# Altium integrated library Integrated_Library_Kylin915.IntLib: 131 symbols
Pins are listed as number, name and electrical type; pins without a type are passive.

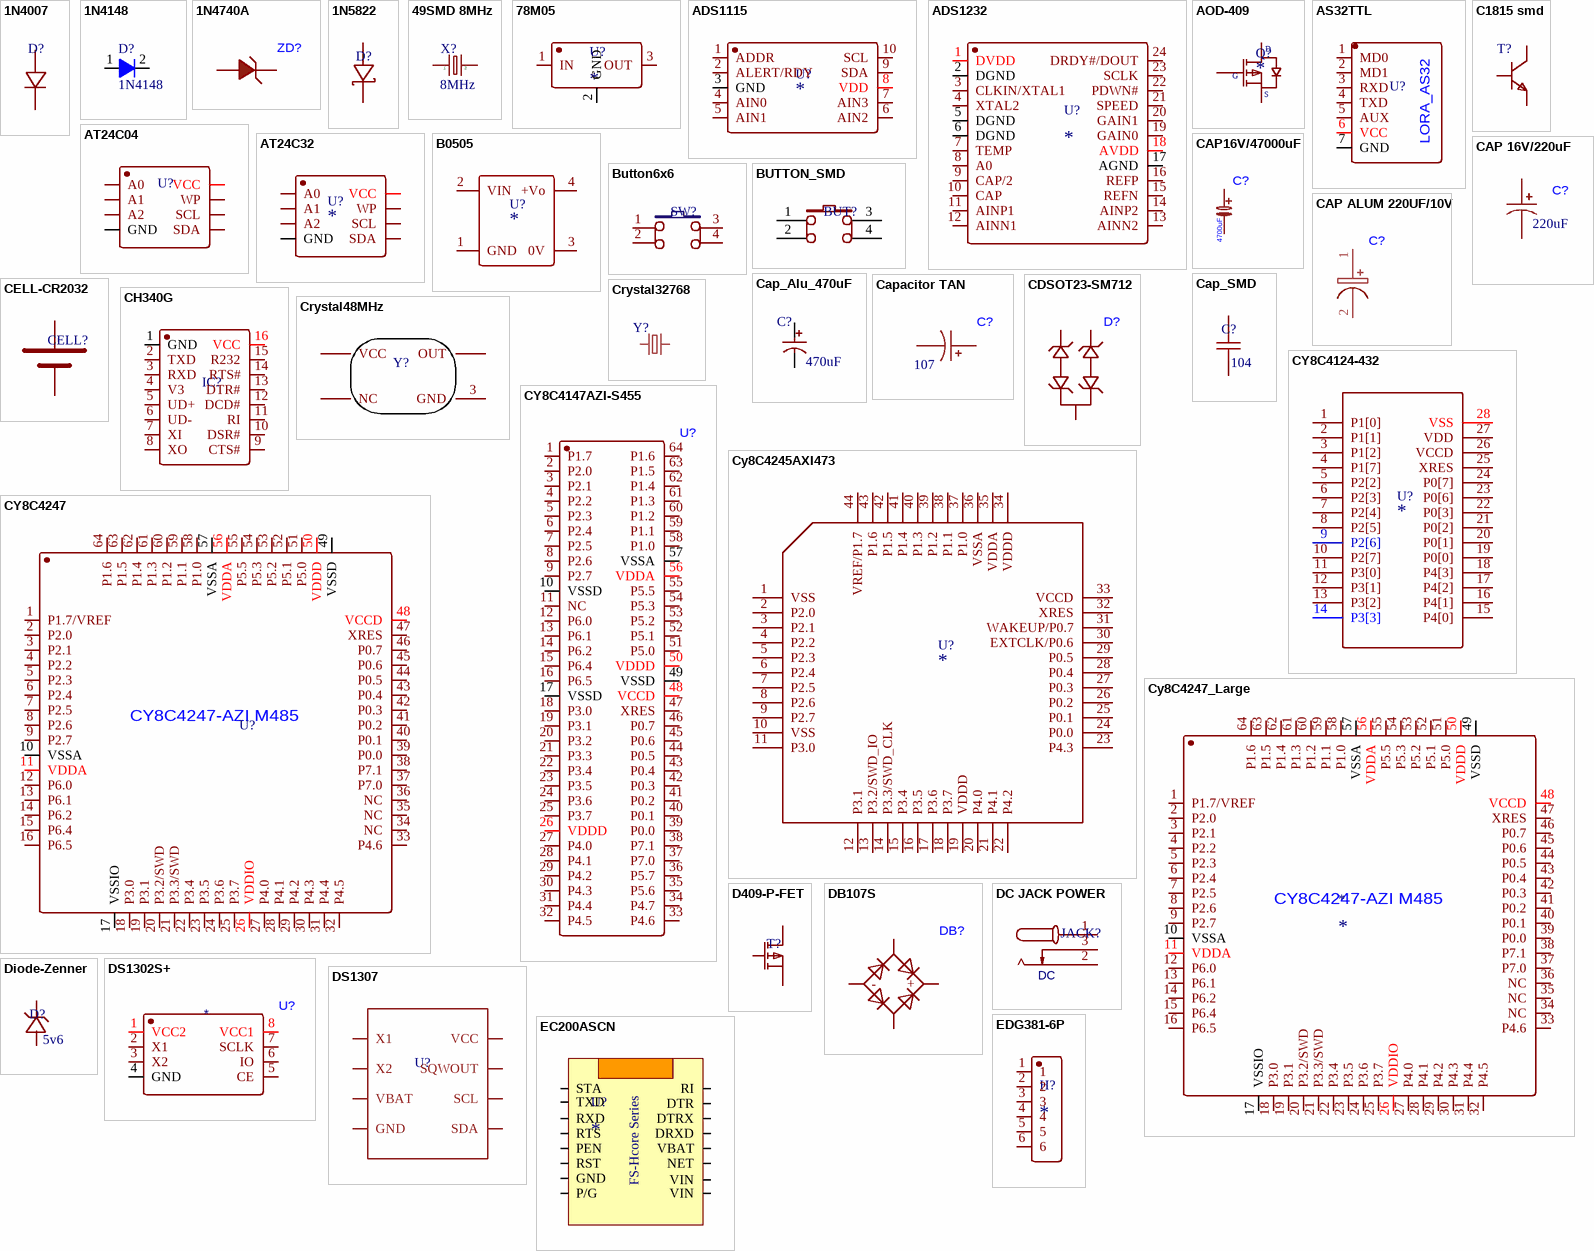
[diagram p0: symbols 1N4007 to EDG381-6P]

## 1N4007
designator D?  (value not drawn)
diode SMD M7
footprint Diode M7 (diode reflectifer)
pins: 1 A, 2 K

## 1N4148
designator D?
Diode Fast Switching; Value: 1N4148
footprint SOD-123
pins: 1 A, 2 K

## 1N4740A
designator ZD?
Zenner diode 10V smd
footprint 1N4740A (1N4740A smd zm4740)
pins: 1 A, 2 K

## 1N5822
designator D?  (value not drawn)
Didoe Schotky SS34 SMD
footprint Diode SS34 (diode schotky)
pins: 1 A, 2 K

## 49SMD 8MHz
designator X?  value 8MHz  (hidden comment: *)
Crystal 49SMD
footprint 49SMD (Crystal 8MHz 49SMD)
pins: 1, 2

## 78M05
designator U?
IC linear voltage
footprint TO252-3 (Pin package to 252)
pins: 1 IN, 2 GND, 3 OUT

## ADS1115
designator U?
AD conveter 24bits 80sps
footprint SOP10 (for ADS1115)
pins: 1 ADDR, 2 ALERT/RDY, 3 GND, 4 AIN0, 5 AIN1, 6 AIN2, 7 AIN3, 8 VDD, 9 SDA, 10 SCL

## ADS1232
designator U?
IC ADC 24bis high precesion
footprint TSOP24 (IC ADS1232)
pins: 1 DVDD, 2 DGND, 3 CLKIN/XTAL1, 4 XTAL2, 5 DGND, 6 DGND, 7 TEMP, 8 A0, 9 CAP/2, 10 CAP, 11 AINP1, 12 AINN1, 13 AINN2, 14 AINP2, 15 REFN, 16 REFP, 17 AGND, 18 AVDD, 19 GAIN0, 20 GAIN1, 21 SPEED, 22 PDWN#, 23 SCLK, 24 DRDY#/DOUT

## AOD-409
designator Q?
P-chanel mosfet  TO252
footprint TO252 (PIN TO252)
pins: 1 G, 2 D, 3 S

## AS32TTL
designator U?  (value not drawn)
module UART lora 1W
footprint AS32TTL (module lora uart)
pins: 1 MD0, 2 MD1, 3 RXD, 4 TXD, 5 AUX, 6 VCC, 7 GND
text: LORA_AS32

## AT24C04
designator U?  (value not drawn)
IC eeprom 1kbits
footprint SOIC8 (SOIC 8 pins)
pins: 1 A0, 2 A1, 3 A2, 4 GND, 5 SDA, 6 SCL, 7 WP, 8 VCC

## AT24C32
designator U?
IC ROM I2C
footprint SOIC8 (SOIC 8 pins)
pins: 1 A0, 2 A1, 3 A2, 4 GND, 5 SDA, 6 SCL, 7 WP, 8 VCC

## B0505
designator U?
IC power isolation
footprint B0505 (IC power isolation 5V)
pins: 1 GND, 2 VIN, 3 0V, 4 +Vo

## Button6x6
designator SW?  (value not drawn)
button 6x6 mm
footprint Key6x6Dip (button 6x6x6mm)
footprint Button6x6smd (key smd)
pins: 1, 2, 3, 4

## BUTTON_SMD
designator BUT?  (value not drawn)
BUTTON SMD 4 pins
footprint BUTTON_SMD (button smd)
footprint BUTTON12DIP (Button 12x12x9 mm)
footprint BUTTON12SMD (Button 12x12smd)
pins: 1, 2, 3, 4

## C1815 smd
designator T?  (value not drawn)
C1815 smd sop23
footprint SOT-23 (BIJ-SOT23)
pins: 1 B, 2 E, 3 C

## CAP16V/47000uF
designator C?
4.700uF/16V_CAP-D16.0XF7.5
footprint CAP16V/47000uF (4.700UF/16V_CAP-D16.0XF7.5)
pins: 1, 2
text: 4700uF

## CAP 16V/220uF
designator C?  value 220uF
CAPACITOR POLYMER
footprint CAP POLY 220UF 16V (CAPACITOR POLYMER 220UF 16V 8X9MM SMD)
pins: 1, 2

## CAP ALUM 220UF/10V
designator C?
CAP ALUM 220UF 20% 10V SMD
footprint CAP ALUM 220UF /10V (CAP ALUM 220UF 20% 10V SMD)
pins: 1 +, 2 -

## Cap_Alu_470uF
designator C?  value 470uF  (hidden comment: *)
Cap aluminum 470uF
footprint Cap_Alu_470uF (470uF 16-50V)
pins: 1, 2

## Cap_SMD
designator C?  value 104  (hidden comment: *)
Cap SMD multiple types as 0402 0603 0805 1206
footprint CAP_SMD_0402 (cap smd 0402)
footprint CAP_SMD_0603 (CAP SMD 0603)
footprint Cap_SMD_0805 (cap smd 0805)
footprint CAP_SMD_1206 (cap smd 1206)
pins: 1, 2

## Capacitor TAN
designator C?  value 107
Tantalum7343 (2917)
footprint TANTALUM_CASE-V_EIA-7343 (CP_TANTALUM_CASE-V_EIA-7343-20_WAVE)
pins: 1, 2

## CDSOT23-SM712
designator D?
diode tvs 12V
footprint SOT-23-3
pins: 1, 2, 3

## CELL-CR2032
designator CELL?  (value not drawn)
CELL COIN
footprint CR2032 (CELL COIN)
footprint CR1220 (COIN CELL CR1220)
pins: 1 BAT+, 2 BAT-

## CH340G
designator IC?  (value not drawn)
CH340G smd
footprint CH340G (IC UART TLL)
pins: 1 GND, 2 TXD, 3 RXD, 4 V3, 5 UD+, 6 UD-, 7 XI, 8 XO, 9 CTS#, 10 DSR#, 11 RI, 12 DCD#, 13 DTR#, 14 RTS#, 15 R232, 16 VCC

## Crystal48MHz
designator Y?  (value not drawn)
crystal 48MHz 4 pins
footprint Crystal48MHZ (4pins crystal)
pins: 1 NC, 2 VCC, 3 GND, 4 OUT

## Crystal32768
designator Y?  (value not drawn)
crystal real time clock
footprint CrystalDIP (crystal 32768 dip)
pins: 1, 2

## CY8C4124-432
designator U?
MCU PSOC
footprint SSOP28 (28 pin ssop)
pins: 1 P1[0], 2 P1[1], 3 P1[2], 4 P1[7], 5 P2[2], 6 P2[3], 7 P2[4], 8 P2[5], 9 P2[6], 10 P2[7], 11 P3[0], 12 P3[1], 13 P3[2], 14 P3[3], 15 P4[0], 16 P4[1], 17 P4[2], 18 P4[3], 19 P0[0], 20 P0[1], 21 P0[2], 22 P0[3], 23 P0[6], 24 P0[7], 25 XRES, 26 VCCD, 27 VDD, 28 VSS

## CY8C4147AZI-S455
designator U?
footprint TQFP-64_L10.0-W10.0 (TQFP-64_L10.0-W10.0-P0.50-LS12.0-BL)
pins: 1 P1.7, 2 P2.0, 3 P2.1, 4 P2.2, 5 P2.3, 6 P2.4, 7 P2.5, 8 P2.6, 9 P2.7, 10 VSSD, 11 NC, 12 P6.0, 13 P6.1, 14 P6.2, 15 P6.4, 16 P6.5, 17 VSSD, 18 P3.0, 19 P3.1, 20 P3.2, 21 P3.3, 22 P3.4, 23 P3.5, 24 P3.6, 25 P3.7, 26 VDDD, 27 P4.0, 28 P4.1, 29 P4.2, 30 P4.3, 31 P4.4, 32 P4.5, 33 P4.6, 34 P4.7, 35 P5.6, 36 P5.7, 37 P7.0, 38 P7.1, 39 P0.0, 40 P0.1, 41 P0.2, 42 P0.3, 43 P0.4, 44 P0.5, 45 P0.6, 46 P0.7, 47 XRES, 48 VCCD, 49 VSSD, 50 VDDD, 51 P5.0, 52 P5.1, 53 P5.2, 54 P5.3, 55 P5.5, 56 VDDA, 57 VSSA, 58 P1.0, 59 P1.1, 60 P1.2, 61 P1.3, 62 P1.4, 63 P1.5, 64 P1.6

## Cy8C4245AXI473
designator U?
PSOC ARM M0+ 44 pins
pins: 1 VSS, 2 P2.0, 3 P2.1, 4 P2.2, 5 P2.3, 6 P2.4, 7 P2.5, 8 P2.6, 9 P2.7, 10 VSS, 11 P3.0, 12 P3.1, 13 P3.2/SWD_IO, 14 P3.3/SWD_CLK, 15 P3.4, 16 P3.5, 17 P3.6, 18 P3.7, 19 VDDD, 20 P4.0, 21 P4.1, 22 P4.2, 23 P4.3, 24 P0.0, 25 P0.1, 26 P0.2, 27 P0.3, 28 P0.4, 29 P0.5, 30 EXTCLK/P0.6, 31 WAKEUP/P0.7, 32 XRES, 33 VCCD, 34 VDDD, 35 VDDA, 36 VSSA, 37 P1.0, 38 P1.1, 39 P1.2, 40 P1.3, 41 P1.4, 42 P1.5, 43 P1.6, 44 VREF/P1.7

## CY8C4247
designator U?  (value not drawn)
Psoc Cy8c4247 64 pins
footprint TQFP64 (TQFP 64 pins)
pins: 1 P1.7/VREF, 2 P2.0, 3 P2.1, 4 P2.2, 5 P2.3, 6 P2.4, 7 P2.5, 8 P2.6, 9 P2.7, 10 VSSA, 11 VDDA, 12 P6.0, 13 P6.1, 14 P6.2, 15 P6.4, 16 P6.5, 17 VSSIO, 18 P3.0, 19 P3.1, 20 P3.2/SWD, 21 P3.3/SWD, 22 P3.4, 23 P3.5, 24 P3.6, 25 P3.7, 26 VDDIO, 27 P4.0, 28 P4.1, 29 P4.2, 30 P4.3, 31 P4.4, 32 P4.5, 33 P4.6, 34 NC, 35 NC, 36 NC, 37 P7.0, 38 P7.1, 39 P0.0, 40 P0.1, 41 P0.2, 42 P0.3, 43 P0.4, 44 P0.5, 45 P0.6, 46 P0.7, 47 XRES, 48 VCCD, 49 VSSD, 50 VDDD, 51 P5.0, 52 P5.1, 53 P5.2, 54 P5.3, 55 P5.5, 56 VDDA, 57 VSSA, 58 P1.0, 59 P1.1, 60 P1.2, 61 P1.3, 62 P1.4, 63 P1.5, 64 P1.6
text: CY8C4247-AZI M485

## Cy8C4247_Large
designator *
footprint LQFP64 (LQFP64pins)
footprint LQFP64_double (2 footptints)
pins: 1 P1.7/VREF, 2 P2.0, 3 P2.1, 4 P2.2, 5 P2.3, 6 P2.4, 7 P2.5, 8 P2.6, 9 P2.7, 10 VSSA, 11 VDDA, 12 P6.0, 13 P6.1, 14 P6.2, 15 P6.4, 16 P6.5, 17 VSSIO, 18 P3.0, 19 P3.1, 20 P3.2/SWD, 21 P3.3/SWD, 22 P3.4, 23 P3.5, 24 P3.6, 25 P3.7, 26 VDDIO, 27 P4.0, 28 P4.1, 29 P4.2, 30 P4.3, 31 P4.4, 32 P4.5, 33 P4.6, 34 NC, 35 NC, 36 NC, 37 P7.0, 38 P7.1, 39 P0.0, 40 P0.1, 41 P0.2, 42 P0.3, 43 P0.4, 44 P0.5, 45 P0.6, 46 P0.7, 47 XRES, 48 VCCD, 49 VSSD, 50 VDDD, 51 P5.0, 52 P5.1, 53 P5.2, 54 P5.3, 55 P5.5, 56 VDDA, 57 VSSA, 58 P1.0, 59 P1.1, 60 P1.2, 61 P1.3, 62 P1.4, 63 P1.5, 64 P1.6
text: CY8C4247-AZI M485

## D409-P-FET
designator T?  (value not drawn)
Mosfet p channel
footprint TO252 (PIN TO252)
pins: 1 G, 2 D, 3 S

## DB107S
designator DB?
Diode bridge 1A 1000V
footprint DB107S
pins: 1 C1, 2 C2, 3 +, 4 -

## DC JACK POWER
designator JACK?  (value not drawn)
Jack DC power supply
footprint DC-JACK power (jack dc poer 5.5x2.1mm)
pins: 1, 2, 3
text: DC

## Diode-Zenner
designator D?  value 5v6  (hidden comment: *)
Diode zenner
footprint Diode Zener (diode zener smd)
pins: 1 A, 2 K

## DS1302S+
designator U?
IC RTC 2.0 - 5V
footprint SOIC-8
pins: 1 VCC2, 2 X1, 3 X2, 4 GND, 5 CE, 6 IO, 7 SCLK, 8 VCC1

## DS1307
designator U?  (value not drawn)
IS RTC DS1307
footprint DS1307 (SOP8 DS1307)
pins: 1 X1, 2 X2, 3 VBAT, 4 GND, 5 SDA, 6 SCL, 7 SQWOUT, 8 VCC

## EC200ASCN
designator U?
module SIM LTE cat1
footprint FS-Hcore
pins: 1 STA, 2 TXD, 3 RXD, 4 RTS, 5 PEN, 6 RST, 7 GND, 8 P/G, 9 VIN, 10 VIN, 11 NET, 12 VBAT, 13 DRXD, 14 DTRX, 15 DTR, 16 RI
text: FS-Hcore Series

## EDG381-6P
designator H?
edg 3.81mm 6 pin
footprint EDG381_6P (header edg 3.81 mm)
pins: 1, 2, 3, 4, 5, 6

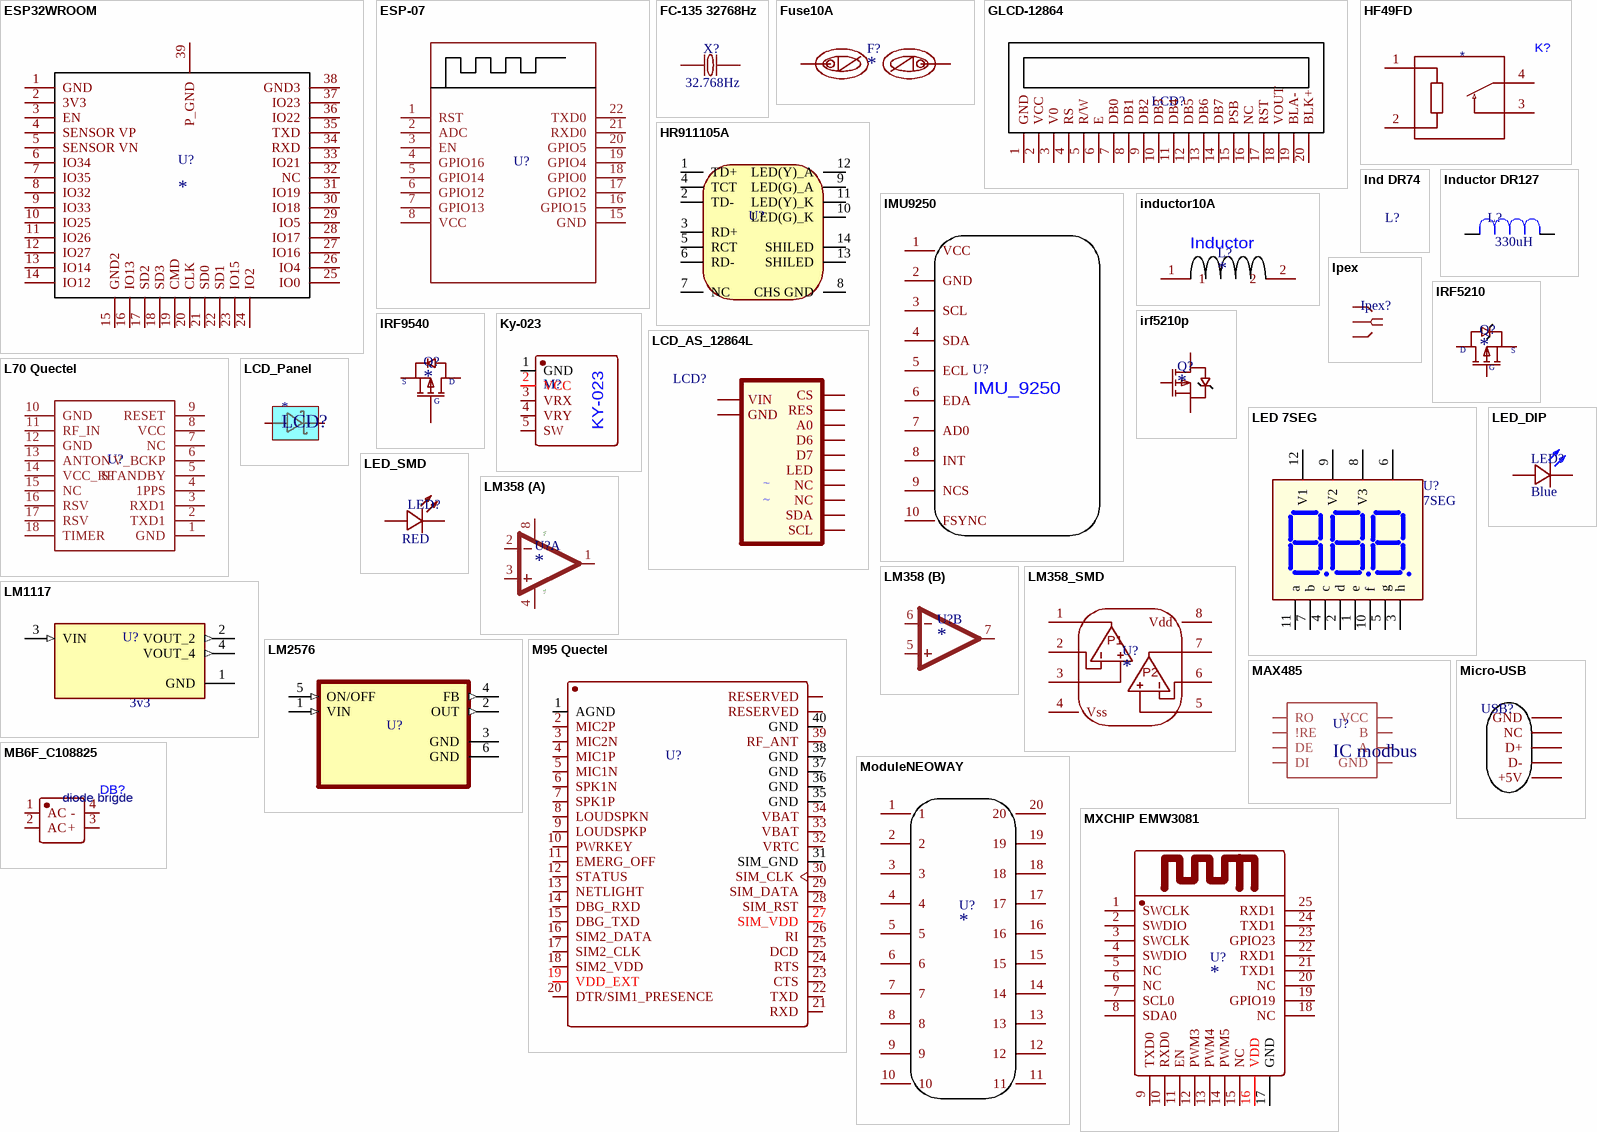
[diagram p1: symbols ESP32WROOM to MXCHIP EMW3081]

## ESP32WROOM
designator U?
esp wroom wifi
footprint ESP32WROOM (esp wifi)
pins: 1 GND, 2 3V3, 3 EN, 4 SENSOR VP, 5 SENSOR VN, 6 IO34, 7 IO35, 8 IO32, 9 IO33, 10 IO25, 11 IO26, 12 IO27, 13 IO14, 14 IO12, 15 GND2, 16 IO13, 17 SD2, 18 SD3, 19 CMD, 20 CLK, 21 SD0, 22 SD1, 23 IO15, 24 IO2, 25 IO0, 26 IO4, 27 IO16, 28 IO17, 29 IO5, 30 IO18, 31 IO19, 32 NC, 33 IO21, 34 RXD, 35 TXD, 36 IO22, 37 IO23, 38 GND3, 39 P_GND

## ESP-07
designator U?  (value not drawn)
ESP 8266 v07 wifi
footprint ESP-07 (module wifi)
pins: 1 RST, 2 ADC, 3 EN, 4 GPIO16, 5 GPIO14, 6 GPIO12, 7 GPIO13, 8 VCC, 15 GND, 16 GPIO15, 17 GPIO2, 18 GPIO0, 19 GPIO4, 20 GPIO5, 21 RXD0, 22 TXD0

## FC-135 32768Hz
designator X?  value 32.768Hz  (hidden comment: *)
Crystal 32768Hz clock
footprint FC-135 (Crystal 32768Hz)
pins: 1, 2

## Fuse10A
designator F?
Fuse 10A 5x20mm
footprint Fuse5x20 (Fuse 10A Dip 5x20)
pins: 1, 2

## GLCD-12864
designator LCD?  (value not drawn)
graphic lcd 12864 st7920
footprint GLCD12864 (Graphic LCD 12864)
pins: 1 GND, 2 VCC, 3 V0, 4 RS, 5 R/W, 6 E, 7 DB0, 8 DB1, 9 DB2, 10 DB3, 11 DB4, 12 DB5, 13 DB6, 14 DB7, 15 PSB, 16 NC, 17 RST, 18 VOUT, 19 BLA-, 20 BLK+

## HF49FD
designator K?
relay HF49fdHF49FD/005-1H12T
footprint RELAY_HF49FD (RELAY_HF49FD/005-1H12T)
footprint HF49FD-005 (HF49FD-    5Volt     005-1H11_THT_4P)
footprint RelayHF49FD-012-1-11HG (HF49 011 HongFa)
pins: 1, 2, 3, 4

## HR911105A
designator U?  (value not drawn)
Port LAN Ethernet
footprint HR911105A (Port LAN)
pins: 1 TD+, 2 TD-, 3 RD+, 4 TCT, 5 RCT, 6 RD-, 7 NC, 8 CHS GND, 9 LED(G)_A, 10 LED(G)_K, 11 LED(Y)_K, 12 LED(Y)_A, 13 SHILED, 14 SHILED

## IMU9250
designator U?  (value not drawn)
imu 9250 9 axis 9 truc
footprint IMU9250 (module 9 axis)
pins: 1 VCC, 2 GND, 3 SCL, 4 SDA, 5 ECL, 6 EDA, 7 AD0, 8 INT, 9 NCS, 10 FSYNC
text: IMU_9250

## Ind DR74
designator L?  (value not drawn)
Ind DR74 8.5mm

## inductor10A
designator L?
inductor 10A
pins: 1, 2
text: Inductor

## Inductor DR127
designator L?  value 330uH  (hidden comment: *)
Inductor SMD DR127 - 12.5mm
footprint Inductor DR127 (Ind 12.5x12.5 mm)
pins: 1, 2

## Ipex
designator Ipex?  (value not drawn)
ipex connector samtech
footprint Ipex (iPEX antenna)
pins: 1, 2 GND, 3 GND

## IRF5210
designator Q?
P-chanel Mosfet
footprint TO220 (Dip 3 pin TO220)
pins: 1 G, 2 D, 3 S

## irf5210p
designator Q?
irf5210p-channel
footprint TO220-3FET (TO220-3MOSFET)
pins: 1 G, 2 D, 3 S

## IRF9540
designator Q?
P-chanel Mosfet power
footprint TO220 (Dip 3 pin TO220)
pins: 1 G, 2 D, 3 S

## Ky-023
designator M?  (value not drawn)
Module JoyStick
footprint KY-023 (Module JoyStick)
pins: 1 GND, 2 VCC, 3 VRX, 4 VRY, 5 SW
text: KY-023

## L70 Quectel
designator U?  (value not drawn)
Quectel L70 module GPS
footprint L70-Quectel (Module GPS L70)
pins: 1 GND, 2 TXD1, 3 RXD1, 4 1PPS, 5 STANDBY, 6 V_BCKP, 7 NC, 8 VCC, 9 RESET, 10 GND, 11 RF_IN, 12 GND, 13 ANTON, 14 VCC_RF, 15 NC, 16 RSV, 17 RSV, 18 TIMER

## LCD_AS_12864L
designator LCD?  (value not drawn)
LCD 12864 intergate RTC
footprint LCD_AS12864 (LCD_12864_AS)
pins: 1 SCL, 2 SDA, 3 NC, 4 NC, 5 LED, 6 D7, 7 D6, 8 A0, 9 RES, 10 CS, 11 VIN, 12 GND
text: ~

## LCD_Panel
designator *, comment LCD?
LCD panel
footprint LCD_Panel12864 (lcd panel)
pins: 1 A, 2 K

## LED 7SEG
designator U?, comment 7SEG
Three 7 Seg Dipslay; Value: LED 7Q SEG
footprint 7SEG (DIP 12 Leads; Body 48 x 20 mm; Pitch 0.5 mm)
pins: 1 e, 2 d, 3 h, 4 c, 5 g, 6 V4, 7 b, 8 V3, 9 V2, 10 f, 11 a, 12 V1

## LED_DIP
designator LED?  (value not drawn)
LED DIP 3/5 mm
footprint LED3 (led 3mm)
footprint LED5 (led 5mm)
pins: 1 A, 2 K
text: Blue

## LED_SMD
designator LED?  value RED  (hidden comment: *)
LED SMD 0603 0805 1206
footprint LED_SMD_0603 (led smd 0603)
footprint LED_SMD_0805 (led smd 0805)
footprint LED_SMD_1206 (LED smd 1206)
pins: 1 A, 2 K

## LM358
designator U?
IC OPAM LM358
part A pins: 1 OUT, 2 -IN, 3 +IN, 4 V-, 8 V+
part B pins: 5 +IN, 6 -IN, 7 OUT

## LM358_SMD
designator U?
Opam
footprint SOIC8 (SOIC 8 pins)
pins: 1 OUTPUT1, 2 INPUT1 -, 3 INPUT1 +, 4 Vss, 5 INPUT2 +, 6 INPUT2 -, 7 OUTPUT2, 8 Vdd
text: P1; P2

## LM1117
designator U?  value 3v3  (hidden comment: *)
IC LDO 3.3Volt
footprint LM1117 (IC LDO 3.3Volt)
pins: 1 GND (power), 2 VOUT_2 (out), 3 VIN (in), 4 VOUT_4 (out)

## LM2576
designator U?  (value not drawn)
IC Buck 5Volt
footprint LM2576-5.0 (IC buck 5.0 Volt)
pins: 1 VIN (in), 2 OUT (out), 3 GND (power), 4 FB (out), 5 ON/OFF (in), 6 GND (power)

## M95 Quectel
designator U?  (value not drawn)
module SIM GSM quectel M95
footprint Quectel M95 (module Sim GSM)
pins: 1 AGND, 2 MIC2P, 3 MIC2N, 4 MIC1P, 5 MIC1N, 6 SPK1N, 7 SPK1P, 8 LOUDSPKN, 9 LOUDSPKP, 10 PWRKEY, 11 EMERG_OFF, 12 STATUS, 13 NETLIGHT, 14 DBG_RXD, 15 DBG_TXD, 16 SIM2_DATA, 17 SIM2_CLK, 18 SIM2_VDD, 19 VDD_EXT, 20 DTR/SIM1_PRESENCE, 21 RXD, 22 TXD, 23 CTS, 24 RTS, 25 DCD, 26 RI, 27 SIM_VDD, 28 SIM_RST, 29 SIM_DATA, 30 SIM_CLK, 31 SIM_GND, 32 VRTC, 33 VBAT, 34 VBAT, 35 GND, 36 GND, 37 GND, 38 GND, 39 RF_ANT, 40 GND, 41 RESERVED, 42 RESERVED

## MAX485
designator U?, comment IC modbus
Modbus 485
footprint MAX485 (max485 sop8 pins)
pins: 1 RO, 2 !RE, 3 DE, 4 DI, 5 GND, 6 A, 7 B, 8 VCC

## MB6F_C108825
designator DB?, comment diode brigde
footprint DIO-BG-SMD_MBF-TL
pins: 1 AC, 2 AC, 3 +, 4 -

## Micro-USB
designator USB?  (value not drawn)
Micro usb connector
footprint Micro-USB (micro USB connector)
pins: 1 +5V, 2 D-, 3 D+, 4 NC, 5 GND

## ModuleNEOWAY
designator U?
module 4G neoway
footprint ModuleNEOWAY (module 4G neoway)
footprint MODULENEOWAY_INV (module 4g inverse)
pins: 1, 2, 3, 4, 5, 6, 7, 8, 9, 10, 11, 12, 13, 14, 15, 16, 17, 18, 19, 20

## MXCHIP EMW3081
designator U?
module wifi EMW3081
footprint MXCHIP EMW (EMW3081)
pins: 1 SWCLK, 2 SWDIO, 3 SWCLK, 4 SWDIO, 5 NC, 6 NC, 7 SCL0, 8 SDA0, 9 TXD0, 10 RXD0, 11 EN, 12 PWM3, 13 PWM4, 14 PWM5, 15 NC, 16 VDD, 17 GND, 18 NC, 19 GPIO19, 20 NC, 21 TXD1, 22 RXD1, 23 GPIO23, 24 TXD1, 25 RXD1

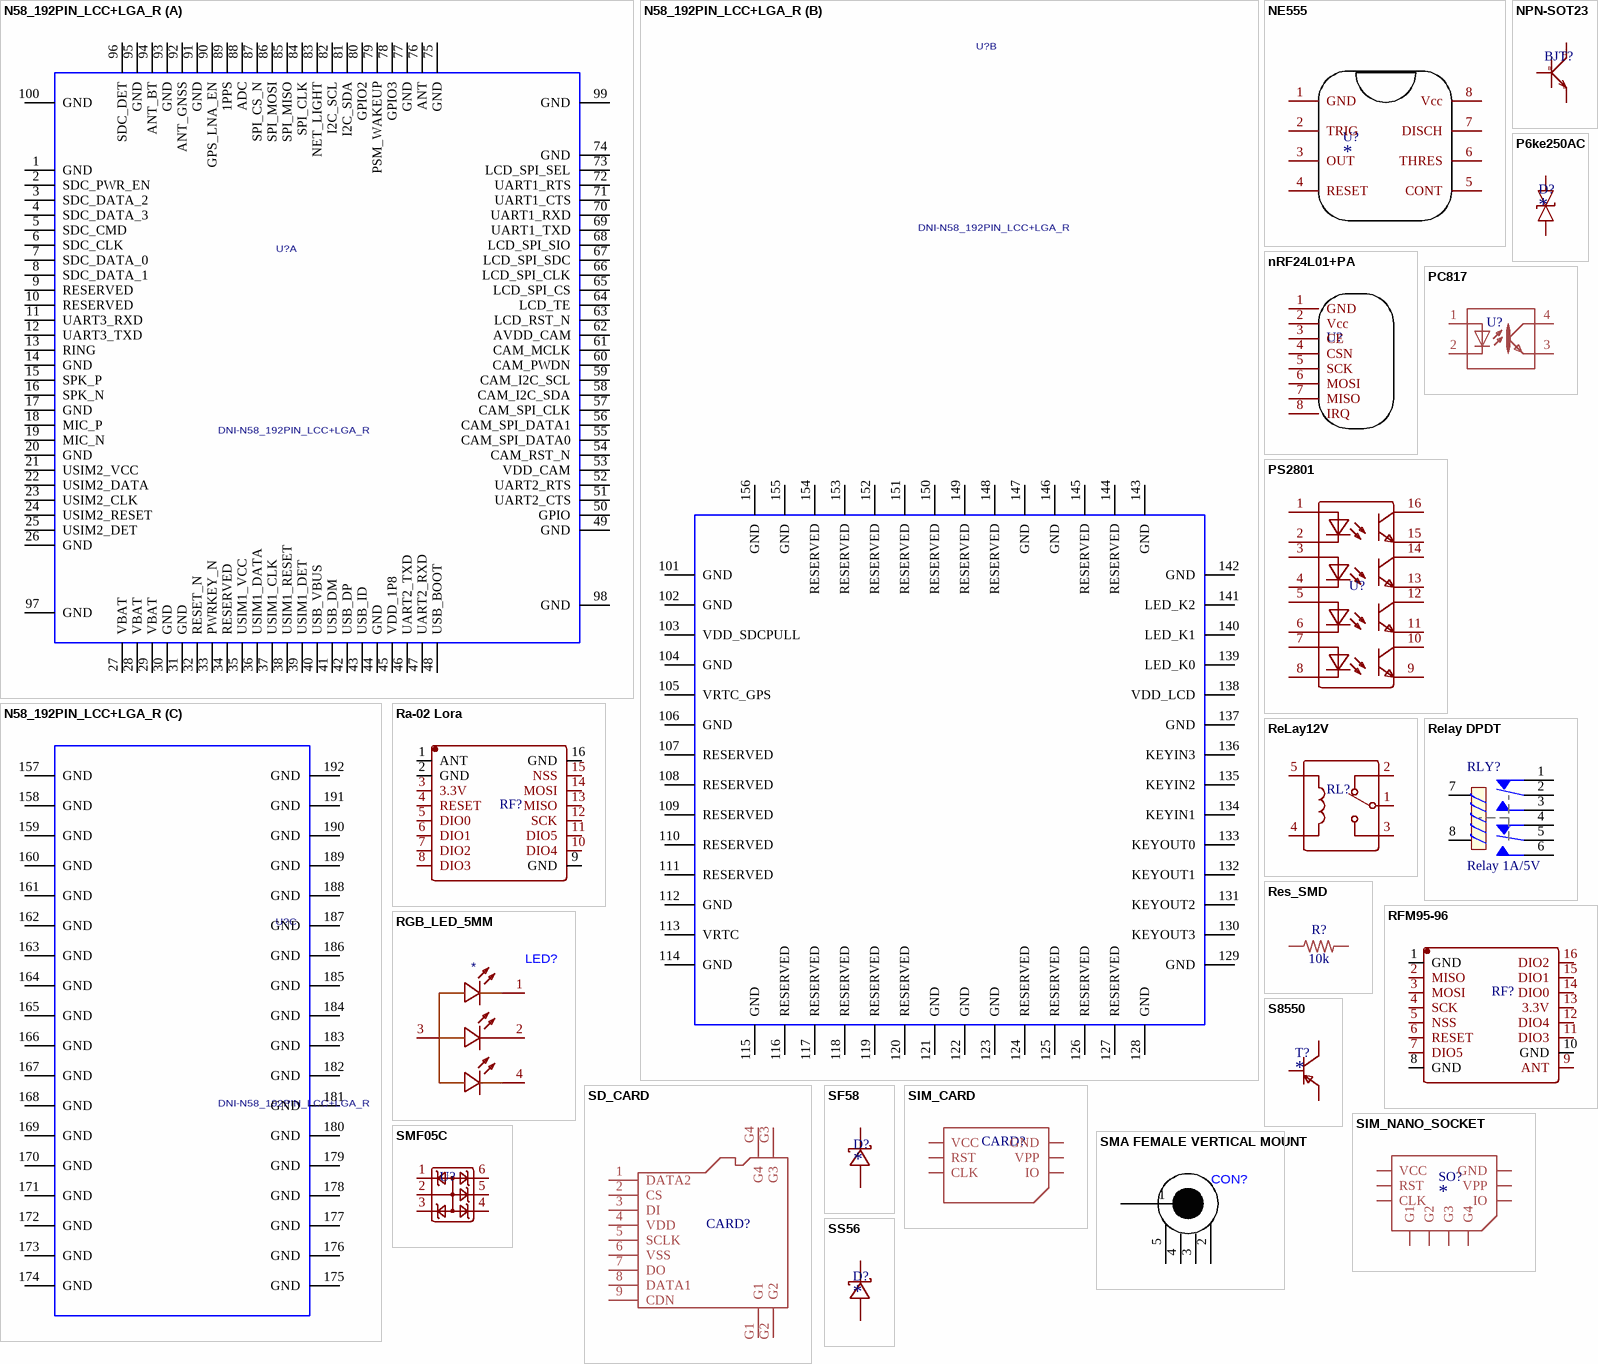
[diagram p2: symbols N58_192PIN_LCC+LGA_R to SS56]

## N58_192PIN_LCC+LGA_R
designator U?  value DNI-N58_192PIN_LCC+LGA_R  (hidden comment: N58_192PIN_LCC+LGA_R)
192pin，LCC92+LGA100，PCB thickness 0.8mm; MFR: NEOWAY; DESC: N58_MODULE_28mm*30mm; Geometry.Height: 2.3mm; PCB Footprint: LCC92+LGA100，28mm*30mm; MPN: N58_192PIN_LCC+LGA_R; TYPE: N58模块推荐封装; PCB DECAL: N58_192PIN_LCC+LGA_R
footprint N58_192PIN_LCC+LGA_R
part A pins: 1 GND, 2 SDC_PWR_EN, 3 SDC_DATA_2, 4 SDC_DATA_3, 5 SDC_CMD, 6 SDC_CLK, 7 SDC_DATA_0, 8 SDC_DATA_1, 9 RESERVED, 10 RESERVED, 11 UART3_RXD, 12 UART3_TXD, 13 RING, 14 GND, 15 SPK_P, 16 SPK_N, 17 GND, 18 MIC_P, 19 MIC_N, 20 GND, 21 USIM2_VCC, 22 USIM2_DATA, 23 USIM2_CLK, 24 USIM2_RESET, 25 USIM2_DET, 26 GND, 27 VBAT, 28 VBAT, 29 VBAT, 30 GND, 31 GND, 32 RESET_N, 33 PWRKEY_N, 34 RESERVED, 35 USIM1_VCC, 36 USIM1_DATA, 37 USIM1_CLK, 38 USIM1_RESET, 39 USIM1_DET, 40 USB_VBUS, 41 USB_DM, 42 USB_DP, 43 USB_ID, 44 GND, 45 VDD_1P8, 46 UART2_TXD, 47 UART2_RXD, 48 USB_BOOT, 49 GND, 50 GPIO, 51 UART2_CTS, 52 UART2_RTS, 53 VDD_CAM, 54 CAM_RST_N, 55 CAM_SPI_DATA0, 56 CAM_SPI_DATA1, 57 CAM_SPI_CLK, 58 CAM_I2C_SDA, 59 CAM_I2C_SCL, 60 CAM_PWDN, 61 CAM_MCLK, 62 AVDD_CAM, 63 LCD_RST_N, 64 LCD_TE, 65 LCD_SPI_CS, 66 LCD_SPI_CLK, 67 LCD_SPI_SDC, 68 LCD_SPI_SIO, 69 UART1_TXD, 70 UART1_RXD, 71 UART1_CTS, 72 UART1_RTS, 73 LCD_SPI_SEL, 74 GND, 75 GND, 76 ANT, 77 GND, 78 GPIO3, 79 PSM_WAKEUP, 80 GPIO2, 81 I2C_SDA, 82 I2C_SCL, 83 NET_LIGHT, 84 SPI_CLK, 85 SPI_MISO, 86 SPI_MOSI, 87 SPI_CS_N, 88 ADC, 89 1PPS, 90 GPS_LNA_EN, 91 GND, 92 ANT_GNSS, 93 GND, 94 ANT_BT, 95 GND, 96 SDC_DET, 97 GND, 98 GND, 99 GND, 100 GND
part B pins: 101 GND, 102 GND, 103 VDD_SDCPULL, 104 GND, 105 VRTC_GPS, 106 GND, 107 RESERVED, 108 RESERVED, 109 RESERVED, 110 RESERVED, 111 RESERVED, 112 GND, 113 VRTC, 114 GND, 115 GND, 116 RESERVED, 117 RESERVED, 118 RESERVED, 119 RESERVED, 120 RESERVED, 121 GND, 122 GND, 123 GND, 124 RESERVED, 125 RESERVED, 126 RESERVED, 127 RESERVED, 128 GND, 129 GND, 130 KEYOUT3, 131 KEYOUT2, 132 KEYOUT1, 133 KEYOUT0, 134 KEYIN1, 135 KEYIN2, 136 KEYIN3, 137 GND, 138 VDD_LCD, 139 LED_K0, 140 LED_K1, 141 LED_K2, 142 GND, 143 GND, 144 RESERVED, 145 RESERVED, 146 GND, 147 GND, 148 RESERVED, 149 RESERVED, 150 RESERVED, 151 RESERVED, 152 RESERVED, 153 RESERVED, 154 RESERVED, 155 GND, 156 GND
part C pins: 157 GND, 158 GND, 159 GND, 160 GND, 161 GND, 162 GND, 163 GND, 164 GND, 165 GND, 166 GND, 167 GND, 168 GND, 169 GND, 170 GND, 171 GND, 172 GND, 173 GND, 174 GND, 175 GND, 176 GND, 177 GND, 178 GND, 179 GND, 180 GND, 181 GND, 182 GND, 183 GND, 184 GND, 185 GND, 186 GND, 187 GND, 188 GND, 189 GND, 190 GND, 191 GND, 192 GND

## NE555
designator U?
NE5555
pins: 1 GND, 2 TRIG, 3 OUT, 4 RESET, 5 CONT, 6 THRES, 7 DISCH, 8 Vcc

## NPN-SOT23
designator BJT?  (value not drawn)
TRansistor NPN sot23
footprint SOT-23 (BIJ-SOT23)
pins: 1, 2, 3
text: C; B; E

## nRF24L01+PA
designator U?  (value not drawn)
module 2.4G
footprint nRF24L01+PA (module 2.4G)
pins: 1 GND, 2 Vcc, 3 CE, 4 CSN, 5 SCK, 6 MOSI, 7 MISO, 8 IRQ

## P6ke250AC
designator D?
Diode TVS 250V
footprint TVS P6KE (P6KE250AC)
pins: 1 K, 2 A

## PC817
designator U?  (value not drawn)
IC opto
footprint PC817 (IC OPTO isolation)
pins: 1 A, 2 C, 3 EMIT, 4 COL

## PS2801
designator U?  (value not drawn)
ps2801 4channel opto
footprint Sop16pin (sop16pins smd)
pins: 1, 2, 3, 4, 5, 6, 7, 8, 9, 10, 11, 12, 13, 14, 15, 16

## Ra-02 Lora
designator RF?  (value not drawn)
Lora Ra-02
footprint Ra-02 Lora (Lora Ra 02)
pins: 1 ANT, 2 GND, 3 3.3V, 4 RESET, 5 DIO0, 6 DIO1, 7 DIO2, 8 DIO3, 9 GND, 10 DIO4, 11 DIO5, 12 SCK, 13 MISO, 14 MOSI, 15 NSS, 16 GND

## ReLay12V
designator RL?  (value not drawn)
Relay 12V 5Pins
footprint Relay 12V (Relay 5 pins 12V)
pins: 1, 2, 3, 4, 5

## Relay DPDT
designator RLY?, comment Relay 1A/5V
Relay DPDT; Discription: Relay DPDT 5V, 12V - 1A - 5A; Value: Relay - 5V - 1A
footprint RL_DPDT_1A (Reley DPDT, 8 pin, 1A, W400mil, L800mil,H 300mil)
pins: 1, 2, 3, 4, 5, 6, 7, 8

## Res_SMD
designator R?  value 10k  (hidden comment: *)
res smd
footprint Res_SMD_0603 (res smd 0603)
footprint Res_SMD_0402 (res smd 0402)
footprint Res_SMD_0805 (res smd 0805)
footprint Res_SMD_1206 (res smd 1206)
footprint RES_SMD_2512 (Resistor 2512 SMD)
pins: 1, 2

## RFM95-96
designator RF?  (value not drawn)
lora RF 915Mhz without shell
footprint RFM95-96 (Lora RF 915Mhz)
pins: 1 GND, 2 MISO, 3 MOSI, 4 SCK, 5 NSS, 6 RESET, 7 DIO5, 8 GND, 9 ANT, 10 GND, 11 DIO3, 12 DIO4, 13 3.3V, 14 DIO0, 15 DIO1, 16 DIO2

## RGB_LED_5MM
designator LED?
led 4 pins rgb CA 5mm
footprint RGB-5MM
pins: 1 A, 2 A, 3 K, 4 A

## S8550
designator T?
npn transistor
footprint SOT23-3L (sot 23 3 L)
pins: 1 B, 2 E, 3 C

## SD_CARD
designator CARD?  (value not drawn)
micro SD card push pull
footprint SD_CARD (micro SD card holder)
pins: 1 DATA2, 2 CS, 3 DI, 4 VDD, 5 SCLK, 6 VSS, 7 DO, 8 DATA1, 9 CDN, G1, G2, G3, G4

## SF58
designator D?
diode Fast recover
footprint DO210AD (diode DO210AD SF58)
pins: 1 A, 2 K

## SIM_CARD
designator CARD?  (value not drawn)
CARD SIM 6 pins
footprint SIM_CARD (SIM_CARD holder 6 pins)
pins: C1 VCC, C2 RST, C3 CLK, C5 GND, C6 VPP, C7 IO, GND1 GND, GND2 GND, GND3 GND, GND4 GND

## SIM_NANO_SOCKET
designator SO?
Sim nano socket
footprint SIM_NANO_SOCKET (sim nano socket)
pins: C1 VCC, C2 RST, C3 CLK, C5 GND, C6 VPP, C7 IO, G1, G2, G3, G4

## SMA FEMALE VERTICAL MOUNT
designator CON?
Connector RF SMA Vertical dip
footprint SMA FEMALE VERTICAL MOUNT [PCB]
pins: 1, 2, 3, 4, 5

## SMF05C
designator U?  (value not drawn)
ESD TVS array 5Volt - 5pins
footprint SOT-363 (sot 363 6 pins)
pins: 1 C1, 2 CA, 3 C2, 4 C3, 5 C4, 6 C5

## SS56
designator D?
Diode Schottky
footprint SMB
footprint SMC
pins: 1 A, 2 K

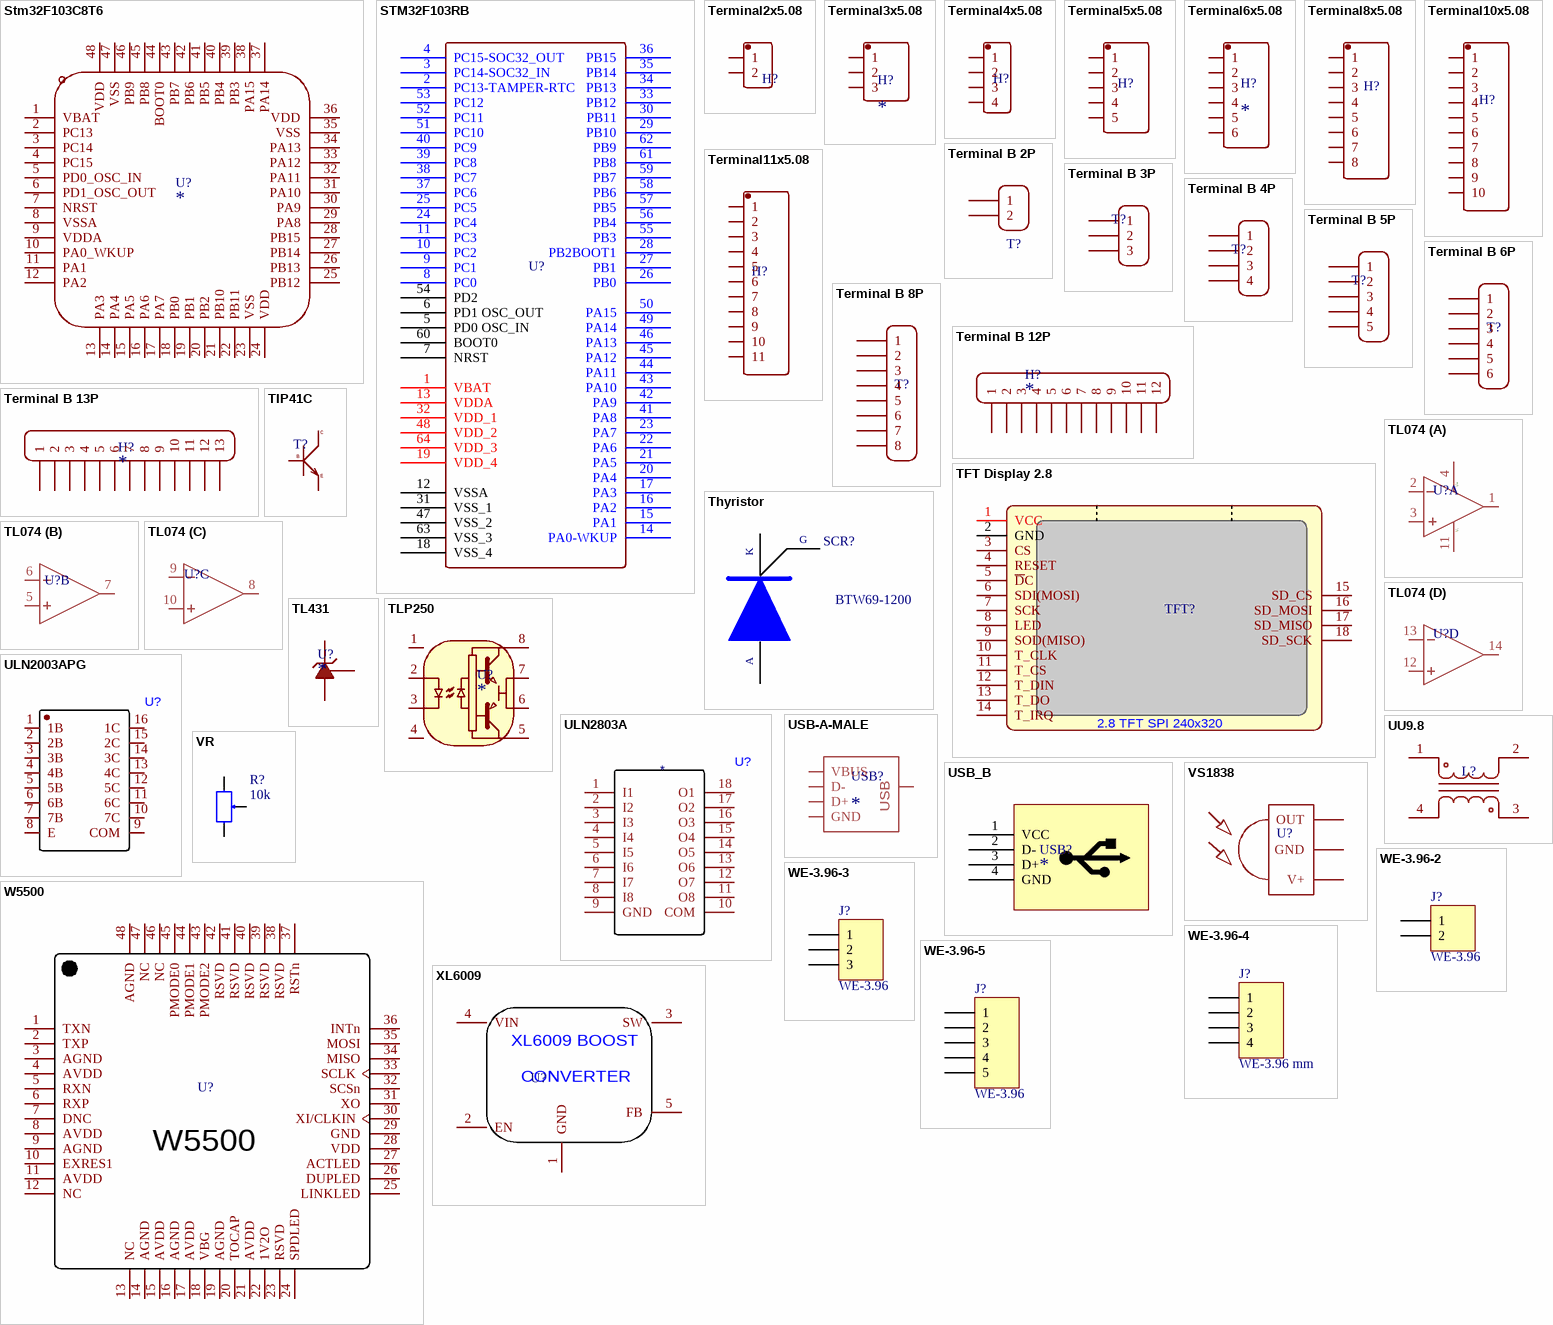
[diagram p3: symbols Stm32F103C8T6 to XL6009]

## Stm32F103C8T6
designator U?
ARM M3 STM32
footprint STM32F103C8T6 (TQFP 48Pons)
pins: 1 VBAT, 2 PC13, 3 PC14, 4 PC15, 5 PD0_OSC_IN, 6 PD1_OSC_OUT, 7 NRST, 8 VSSA, 9 VDDA, 10 PA0_WKUP, 11 PA1, 12 PA2, 13 PA3, 14 PA4, 15 PA5, 16 PA6, 17 PA7, 18 PB0, 19 PB1, 20 PB2, 21 PB10, 22 PB11, 23 VSS, 24 VDD, 25 PB12, 26 PB13, 27 PB14, 28 PB15, 29 PA8, 30 PA9, 31 PA10, 32 PA11, 33 PA12, 34 PA13, 35 VSS, 36 VDD, 37 PA14, 38 PA15, 39 PB3, 40 PB4, 41 PB5, 42 PB6, 43 PB7, 44 BOOT0, 45 PB8, 46 PB9, 47 VSS, 48 VDD

## STM32F103RB
designator U?  (value not drawn)
STM32F103RB 64 pins 72MHz coretex M3
footprint STM32F103RB (MCU M3 63pins 10x10mm)
pins: 1 VBAT, 2 PC13-TAMPER-RTC, 3 PC14-SOC32_IN, 4 PC15-SOC32_OUT, 5 PD0 OSC_IN, 6 PD1 OSC_OUT, 7 NRST, 8 PC0, 9 PC1, 10 PC2, 11 PC3, 12 VSSA, 13 VDDA, 14 PA0-WKUP, 15 PA1, 16 PA2, 17 PA3, 18 VSS_4, 19 VDD_4, 20 PA4, 21 PA5, 22 PA6, 23 PA7, 24 PC4, 25 PC5, 26 PB0, 27 PB1, 28 PB2BOOT1, 29 PB10, 30 PB11, 31 VSS_1, 32 VDD_1, 33 PB12, 34 PB13, 35 PB14, 36 PB15, 37 PC6, 38 PC7, 39 PC8, 40 PC9, 41 PA8, 42 PA9, 43 PA10, 44 PA11, 45 PA12, 46 PA13, 47 VSS_2, 48 VDD_2, 49 PA14, 50 PA15, 51 PC10, 52 PC11, 53 PC12, 54 PD2, 55 PB3, 56 PB4, 57 PB5, 58 PB6, 59 PB7, 60 BOOT0, 61 PB8, 62 PB9, 63 VSS_3, 64 VDD_3

## Terminal2x5.08
designator H?  (value not drawn)
terminal 5.08mm x2 pins
footprint EDG2P508 (edg 2 pins 5.08mm)
pins: 1, 2

## Terminal3x5.08
designator H?
terminal 3 pins
footprint EDG3P508 (edg 3 pins 5.08mm)
pins: 1, 2, 3

## Terminal4x5.08
designator H?  (value not drawn)
terminal 4x5.08mm 4 pins
footprint EDG4P508 (edg 4 pins 5.08mm)
pins: 1, 2, 3, 4

## Terminal5x5.08
designator H?  (value not drawn)
terminal edg 5.08mm 5 pins
footprint EDG5P508 (edg 5pins 5.08mm)
pins: 1, 2, 3, 4, 5

## Terminal6x5.08
designator H?
Terminal 5x08mm 6 pins
footprint EDG6P508 (edg 6pins 5.08mm)
pins: 1, 2, 3, 4, 5, 6

## Terminal8x5.08
designator H?  (value not drawn)
Terminal 8 pins EDG 5x08mm
footprint EDG8P508 (edg 8pins 5.08mm)
pins: 1, 2, 3, 4, 5, 6, 7, 8

## Terminal10x5.08
designator H?  (value not drawn)
Terminal 10 pins EDG 5.08mm
footprint EDG10P508 (edg 10pins 5.08mm)
pins: 1, 2, 3, 4, 5, 6, 7, 8, 9, 10

## Terminal11x5.08
designator H?  (value not drawn)
Terminal 11pins EDG 5.08mm
footprint EDG11P508 (edg 11pins 5.08mm)
pins: 1, 2, 3, 4, 5, 6, 7, 8, 9, 10, 11

## Terminal B 2P
designator T?  (value not drawn)
Terminal Block 3.81 2 pins
footprint Terminal-2p-381 (Terminal 2pins 3.81)
pins: 1, 2

## Terminal B 3P
designator T?  (value not drawn)
Terminal Block 3 pins
footprint Terminal-3p-381 (terminal 3 pins 3.81)
pins: 1, 2, 3

## Terminal B 4P
designator T?  (value not drawn)
Terminal 4 Pins 3.81
footprint terminal-4p-381 (terminal 4 pins 3.81)
footprint CON 7.62 4P (terminal block connector 7.62mm 4pins)
pins: 1, 2, 3, 4

## Terminal B 5P
designator T?  (value not drawn)
Terminal 5 pins 3.81
footprint Terminal-5p-381 (terminal 5 pins 3.81)
pins: 1, 2, 3, 4, 5

## Terminal B 6P
designator T?  (value not drawn)
Terminal 6 pins 3.81
footprint terminal-6p-381 (terminal 6 pins 381)
pins: 1, 2, 3, 4, 5, 6

## Terminal B 8P
designator T?  (value not drawn)
terminal block 3.81 pitch
footprint terminal-8p-381 (terminal 8pins 3.81)
pins: 1, 2, 3, 4, 5, 6, 7, 8

## Terminal B 12P
designator H?
Terminal Block 12 pins 3.81 mm
footprint TERMINAL-12P-381 (EDG3.81mm -12Pins)
pins: 1, 2, 3, 4, 5, 6, 7, 8, 9, 10, 11, 12

## Terminal B 13P
designator H?
Terminal Block 13 pins 3.81mm
footprint TERMINAL-13P-381 (EDG3.81mm -13Pins)
pins: 1, 2, 3, 4, 5, 6, 7, 8, 9, 10, 11, 12, 13

## TFT Display 2.8
designator TFT?  (value not drawn)
Display 2.8inch spi
footprint TFT Display 2.8 (display 2.8inch touch sd card)
pins: 1 VCC, 2 GND, 3 CS, 4 RESET, 5 ~{D}C, 6 SDI(MOSI), 7 SCK, 8 LED, 9 SOD(MISO), 10 T_CLK, 11 T_CS, 12 T_DIN, 13 T_DO, 14 T_IRQ, 15 SD_CS, 16 SD_MOSI, 17 SD_MISO, 18 SD_SCK
text: 2.8 TFT SPI 240x320

## Thyristor
designator SCR?, comment BTW69-1200
Thyristor
footprint TO247 (TO-3P)
pins: 1 K, 2 A, 3 G

## TIP41C
designator T?  (value not drawn)
Transistor NPN
footprint TO252 (PIN TO252)
pins: 1 B, 2 E, 3 C

## TL074
designator U?  (value not drawn)
OPAM
footprint TL074SMD (TL074 sop 14pins)
part A pins: 1 OUT, 2 -IN, 3 +IN, 4 V+, 11 V-
part B pins: 5 +IN, 6 -IN, 7 OUT
part C pins: 8 OUT, 9 -IN, 10 +IN
part D pins: 12 +IN, 13 -IN, 14 OUT

## TL431
designator U?
zenner TL431
footprint TL431 (TL431-SMD)
pins: 1 C, 2 REF, 3 A

## TLP250
designator U?
opto TLP250
footprint Dip8_TLP250 (TL250 DIP 8)
footprint SOP8_TLP250
pins: 1 NC, 2 A, 3 C, 4 NC, 5 VEE, 6 VO, 7 VO, 8 VCC

## ULN2003APG
designator U?
ULN2003APG SOIC16
footprint SO-16 (ULN 2003ADR)
pins: 1 1B, 2 2B, 3 3B, 4 4B, 5 5B, 6 6B, 7 7B, 8 E, 9 COM, 10 7C, 11 6C, 12 5C, 13 4C, 14 3C, 15 2C, 16 1C

## ULN2803A
designator U?
IC Buffer
footprint KIP_ULN2803A
pins: 1 I1, 2 I2, 3 I3, 4 I4, 5 I5, 6 I6, 7 I7, 8 I8, 9 GND, 10 COM, 11 O8, 12 O7, 13 O6, 14 O5, 15 O4, 16 O3, 17 O2, 18 O1

## USB-A-MALE
designator USB?
USB A MALE 2.0 STD
footprint USB 2.0 (USB 2.0 MALE)
pins: D+1 D+, D-1 D-, GND1 GND, SHLD1 SHIELD, SHLD2 SHIELD, VBUS1 VBUS
text: USB

## USB_B
designator USB?
USB- type B
footprint USB_B vertical (USB B vertical)
footprint USB_B_H (usb b horizontal)
pins: 1 VCC, 2 D-, 3 D+, 4 GND

## UU9.8
designator L?  (value not drawn)
EMI Ind Filter schoke
footprint UU9.8 (uu 9.9 7x8mm)
pins: 1, 2, 3, 4

## VR
designator R?, comment 10k
Var Resistor; Value: VR 10K
footprint VarRes (Variable Resistor)
pins: 1, 2, 3

## VS1838
designator U?  (value not drawn)
IR receiver 38kHz
footprint VS1838 (vs 1838 38-40kHZz)
pins: GND, OUT, VCC V+

## W5500
designator U?  (value not drawn)
IC LAN
footprint W5500 (IC LAN W5500)
pins: 1 TXN, 2 TXP, 3 AGND, 4 AVDD, 5 RXN, 6 RXP, 7 DNC, 8 AVDD, 9 AGND, 10 EXRES1, 11 AVDD, 12 NC, 13 NC, 14 AGND, 15 AVDD, 16 AGND, 17 AVDD, 18 VBG, 19 AGND, 20 TOCAP, 21 AVDD, 22 1V2O, 23 RSVD, 24 SPDLED, 25 LINKLED, 26 DUPLED, 27 ACTLED, 28 VDD, 29 GND, 30 XI/CLKIN, 31 XO, 32 SCSn, 33 SCLK, 34 MISO, 35 MOSI, 36 INTn, 37 RSTn, 38 RSVD, 39 RSVD, 40 RSVD, 41 RSVD, 42 RSVD, 43 PMODE2, 44 PMODE1, 45 PMODE0, 46 NC, 47 NC, 48 AGND

## WE-3.96-2
designator J?, comment WE-3.96
WR-WTB 3.96mm Male Locking HeaderWE-3.96 mm Pitch 645002114822; Manufacturer: W¨¹rth Elektronik eiSos GmbH; ComponentLink1 Description: Manufacturer; ComponentLink2 Description: Datasheet; NoPins: 2; Created Date: 16 May 2013; partNo: 645002114822; ComponentLink1URL: http://www.we-online.com; ComponentLink2URL: http://katalog.we-online.de/em/datasheet/6450xx114822.pdf; Created by: Karrer Zheng
footprint 645002114822 (2 pins, straight)
pins: 1, 2

## WE-3.96-3
designator J?, comment WE-3.96
WR-WTB 3.96mm Male Locking Header; Manufacturer: W¨¹rth Elektronik eiSos GmbH; partNo: 645003114822; ComponentLink1 Description: Manufacturer; ComponentLink2 Description: Datasheet; NoPins: 3; Created Date: 16 May 2013; ComponentLink1URL: http://www.we-online.com; ComponentLink2URL: http://katalog.we-online.de/em/datasheet/6450xx114822.pdf; Created by: Karrer Zheng
footprint 645003114822 (3 pins, straight)
pins: 1, 2, 3

## WE-3.96-4
designator J?, comment WE-3.96 mm
WR-WTB 3.96mm Male Locking Header; Manufacturer: W¨¹rth Elektronik eiSos GmbH; partNo: 645004114822; ComponentLink1 Description: Manufacturer; ComponentLink2 Description: Datasheet; NoPins: 4; Created Date: 16 May 2013; ComponentLink1URL: http://www.we-online.com; ComponentLink2URL: http://katalog.we-online.de/em/datasheet/6450xx114822.pdf; Created by: Karrer Zheng
footprint 645004114822 (4 pins, straight)
pins: 1, 2, 3, 4

## WE-3.96-5
designator J?, comment WE-3.96
WR-WTB 3.96mm Male Locking Header; Manufacturer: W¨¹rth Elektronik eiSos GmbH; partNo: 645005114822; ComponentLink1 Description: Manufacturer; ComponentLink2 Description: Datasheet; NoPins: 5; Created Date: 16 May 2013; ComponentLink1URL: http://www.we-online.com; ComponentLink2URL: http://katalog.we-online.de/em/datasheet/6450xx114822.pdf; Created by: Karrer Zheng
footprint 645005114822 (5 pins, straight)
pins: 1, 2, 3, 4, 5

## XL6009
designator U?  (value not drawn)
IC POWER BOOST
footprint XL 6009 (TO 263-5LD)
pins: 1 GND, 2 EN, 3 SW, 4 VIN, 5 FB
text: XL6009 BOOST / CONVERTER

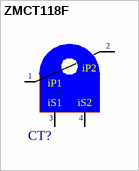
[diagram p4: symbol ZMCT118F]

## ZMCT118F
designator CT?  (value not drawn)
current sensor
footprint ZMCT118F
pins: 1 iP1, 2 iP2, 3 iS1, 4 iS2